# Altium footprint library PcbLib1.PcbLib: 1016 footprints (part 1 of 64)
Each footprint in its own frame and in the unit in brackets; x right, y up, seen from the top. Pads: shape width x height; smd on the part's side, far side on the other; paste and mask are expansions set on the pad; w line width, h text height; cw(c..) or ccw(c..) is an arc to the next point about the centre after c.
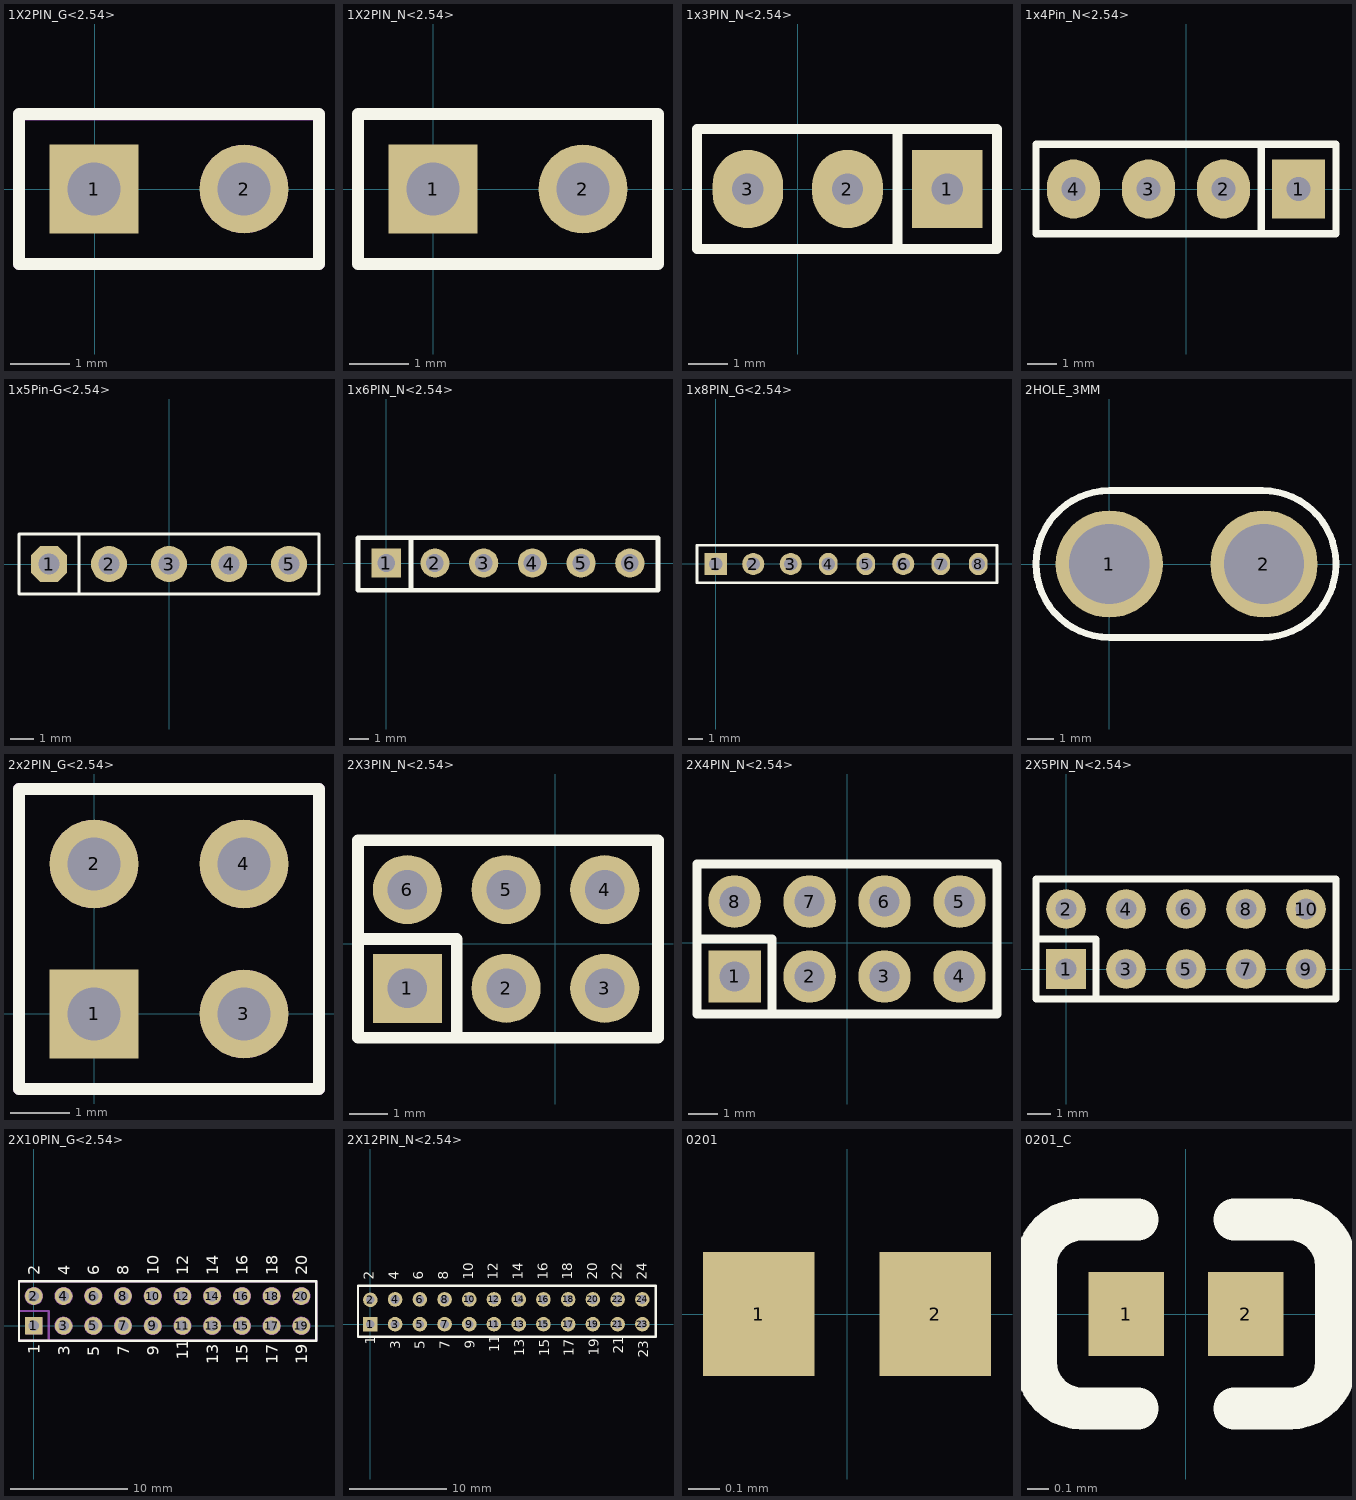
[diagram p0: the footprints below, top view; thin cyan lines are the x and y axes]

## 1X2PIN_G<2.54> [mm]
height 1.1
pads (2):
  rect 1.5x1.5 hole 0.9: 1(-0.01,0.007)
  round 1.5 hole 0.9: 2(2.53,0.007)
Top Overlay:
  lines w0.2: -1.28,-1.263 3.8,-1.263 3.8,1.277 -1.28,1.277 -1.28,-1.263
Mechanical 7:
  circle w0.2: c2.53,0.007 r0.648
  lines w0.2: -1.28,-1.263 -1.28,1.27 3.8,1.27 3.8,-1.263 -1.28,-1.263 ; -0.645,-0.628 0.625,-0.628 0.625,0.642 -0.645,0.642 -0.645,-0.628
3D body "1x2HDR.stp": height 8.41, standoff -2.52, extent -1.279,-1.261 3.801,1.279

## 1X2PIN_N<2.54> [mm] "两针跳线（未加焊）"
pads (2):
  rect 1.5x1.5 hole 0.9: 1(0,0)
  round 1.5 hole 0.9: 2(2.54,0)
Top Overlay:
  lines w0.2: -1.27,-1.27 -1.27,1.27 3.81,1.27 3.81,-1.27 -1.27,-1.27
3D body "HDR1X2_N.stp": height 8.68, standoff -3, extent -1.28,-1.26 3.8,1.28

## 1x3PIN_N<2.54> [mm]
pads (3):
  rect 1.8x2 hole 0.8: 1(3.81,0)
  oval 1.8x2 hole 0.8: 2(1.27,0) 3(-1.27,0)
Top Overlay:
  lines w0.254: 2.54,-1.524 2.54,1.524 ; -2.565,-1.524 5.08,-1.524 5.08,1.524 -2.565,1.524 -2.565,-1.524
3D body "1001-3.STEP": height 8.54, standoff -3, extent -2.54,-1.321 5.08,1.219

## 1x4Pin_N<2.54> [mm]
pads (4):
  rect 1.8x2 hole 0.8: 1(3.81,0)
  oval 1.8x2 hole 0.8: 2(1.27,0) 3(-1.27,0) 4(-3.81,0)
Top Overlay:
  lines w0.254: 2.54,-1.524 2.54,1.524 ; -5.08,-1.524 5.08,-1.524 5.08,1.524 -5.08,1.524 -5.08,-1.524
3D body "1001-4.STEP": height 8.54, standoff -3, extent -5.073,-1.267 5.087,1.273

## 1x5Pin-G<2.54> [mil]
pads (5):
  oct 60x60 hole 35: 1(-200,0)
  round 60 hole 35: 2(-100,0) 3(0,0) 4(100,0) 5(200,0)
Top Overlay:
  lines w5: -250,-50 250,-50 250,50 -250,50 -250,-49 ; -150,-50 -150,50
3D body "0.1inch Pin Strip-5Way.STEP": height 397.64, standoff -59.06, extent -250,-50 250,50

## 1x6PIN_N<2.54> [mm]
pads (6):
  rect 1.5x1.5 hole 0.9: 1(0,0)
  round 1.5 hole 0.9: 2(2.5,0) 3(5,0) 4(7.5,0) 5(10,0) 6(12.5,0)
Top Overlay:
  lines w0.254: 1.27,-1.346 1.27,1.245 ; -1.448,-1.397 -1.448,1.295 13.945,1.295 13.945,-1.397 -1.448,-1.397
3D body "1001-6.STEP": height 8.54, standoff -3, extent -1.372,-1.27 13.868,1.27

## 1x8PIN_G<2.54> [mm] "Connector; Header; 8 Position"
pads (8):
  rect 1.5x1.5 hole 0.9: 1(0,0)
  round 1.5 hole 0.9: 2(2.54,0) 3(5.08,0) 6(12.7,0)
  oval 1.27x1.5 hole 0.9: 4(7.62,0) 5(10.16,0) 7(15.24,0) 8(17.78,0)
Top Overlay:
  lines w0.2: -1.27,-1.27 -1.27,1.27 19.05,1.27 19.05,-1.27 -1.27,-1.27
3D body "8 pin strip.STEP": height 0.7, standoff -10.9, extent -1.27,-1.27 19.05,1.27

## 2HOLE_3MM [mm]
pads (2):
  round 4 hole 3: 1(0,0) 2(5.766,0)
Top Overlay:
  lines w0.25: 5.715,-2.736 ccw(c5.715,0) 5.715,2.736
  lines w0.254: 5.715,-2.736 0,-2.736 cw(c0,0) 0,2.736 5.715,2.736

## 2x2PIN_G<2.54> [mm]
height 1
pads (4):
  rect 1.5x1.5 hole 0.9: 1(0,0)
  round 1.5 hole 0.9: 2(0,2.54) 3(2.54,0) 4(2.54,2.54)
Top Overlay:
  lines w0.2: -1.27,-1.27 -1.27,3.81 3.81,3.81 3.81,-1.27 -1.27,-1.27
Mechanical 7:
  circle w0.2: c2.54,0 r0.648
  circle w0.2: c2.54,2.54 r0.648
  circle w0.2: c0,2.54 r0.648
  lines w0.2: -1.27,-1.27 3.81,-1.27 3.81,3.81 -1.27,3.81 -1.27,-1.27 ; -0.635,-0.635 -0.635,0.635 0.635,0.635 0.635,-0.635 -0.635,-0.635
3D body "HDR2X2.stp": height 8.41, standoff -2.51, extent -1.27,-1.273 3.81,3.807

## 2X3PIN_N<2.54> [mil]
pads (6):
  rect 70x70 hole 40: 1(-150,-45)
  round 70 hole 40: 2(-50,-45) 3(50,-45) 4(50,55) 5(-50,55) 6(-150,55)
Top Overlay:
  lines w12: -200,5 -100,5 -100,-95 ; -200,-95 104,-95 104,105 -200,105 -200,-95
3D body "1001-3.STEP": height 336.22, standoff -118.11, extent -198,-90 102,10
3D body "1001-3.STEP": height 336.22, standoff -118.11, extent -198,3.01 102,103.01

## 2X4PIN_N<2.54> [mil]
pads (8):
  rect 70x70 hole 40: 1(-150,-45)
  round 70 hole 40: 2(-50,-45) 3(50,-45) 4(150,-45) 5(150,55) 6(50,55) 7(-50,55) 8(-150,55)
Top Overlay:
  lines w12: -200,5 -100,5 -100,-95 ; -200,-95 -200,105 200,105 200,-95 -200,-95
3D body "1001-4.STEP": height 336.22, standoff -118.11, extent -198,-95 202,5
3D body "1001-4.STEP": height 336.22, standoff -118.11, extent -198,4 202,104

## 2X5PIN_N<2.54> [mil]
pads (10):
  rect 66x66 hole 35.43: 1(0,0)
  round 66 hole 35.43: 2(0,100) 3(100,0) 4(100,100) 5(200,0) 6(200,100) 7(300,0) 8(300,100) 9(400,0) 10(400,100)
Top Overlay:
  lines w12: -50,50 50,50 50,-50 ; -50,-50 -50,150 450,150 450,-50 -50,-50
3D body "1001-5.STEP": height 336.22, standoff -118.11, extent -49,-55 451,45
3D body "1001-5.STEP": height 336.22, standoff -118.11, extent -49,45 451,145

## 2X10PIN_G<2.54> [mm]
pads (20):
  rect 1.5x1.5 hole 0.9: 1(0,0)
  round 1.5 hole 0.9: 2(0,2.54) 3(2.54,0) 4(2.54,2.54) 5(5.08,0) 6(5.08,2.54) 7(7.62,0) 8(7.62,2.54) 9(10.16,0) 10(10.16,2.54) 11(12.7,0) 12(12.7,2.54) 13(15.24,0) 14(15.24,2.54) 15(17.78,0) 16(17.78,2.54) 17(20.32,0) 18(20.32,2.54) 19(22.86,0) 20(22.86,2.54)
Top Overlay:
  lines w0.2: -1.27,-1.27 -1.27,3.81 24.13,3.81 24.13,-1.27 -1.27,-1.27
  text "18" at 20.828,4.318 h1
  text "17" at 20.828,-3.302 h1
  text "14" at 15.748,4.318 h1
  text "13" at 15.748,-3.302 h1
  text "10" at 10.668,4.318 h1
  text "9" at 10.674,-2.539 h1
  text "8" at 8.128,4.318 h1
  text "7" at 8.134,-2.565 h1
  text "4" at 3.048,4.318 h1
  text "3" at 3.054,-2.565 h1
  text "5" at 5.594,-2.59 h1
  text "11" at 13.208,-2.921 h1
  text "15" at 18.288,-3.302 h1
  text "6" at 5.588,4.318 h1
  text "12" at 13.208,4.318 h1
  text "16" at 18.288,4.318 h1
  text "20" at 23.368,4.318 h1
  text "19" at 23.368,-3.302 h1
  text "1" at 0.514,-2.412 h1
  text "2" at 0.508,4.318 h1
Mechanical 7:
  circle w0.2: c2.54,0 r0.684
  circle w0.2: c5.08,0 r0.684
  circle w0.2: c7.62,0 r0.684
  circle w0.2: c10.16,0 r0.684
  circle w0.2: c12.7,0 r0.684
  circle w0.2: c15.24,0 r0.684
  circle w0.2: c17.78,0 r0.684
  circle w0.2: c20.32,0 r0.684
  circle w0.2: c22.86,0 r0.684
  circle w0.2: c22.86,2.54 r0.684
  circle w0.2: c20.32,2.54 r0.684
  circle w0.2: c17.78,2.54 r0.684
  circle w0.2: c15.24,2.54 r0.684
  circle w0.2: c12.7,2.54 r0.684
  circle w0.2: c10.16,2.54 r0.684
  circle w0.2: c7.62,2.54 r0.684
  circle w0.2: c5.08,2.54 r0.684
  circle w0.2: c2.54,2.54 r0.684
  circle w0.2: c0,2.54 r0.684
  lines w0.2: -1.27,1.27 1.27,1.27 1.27,-1.27 ; -1.27,-1.27 -1.27,3.81 24.13,3.81 24.13,-1.27 -1.27,-1.27 ; -0.635,-0.635 -0.635,0.635 0.635,0.635 0.635,-0.635 -0.635,-0.635
3D body "HDR 20 pin.STEP": height 8.38, standoff -2.54, extent -1.275,-1.263 24.125,3.817

## 2X12PIN_N<2.54> [mm] "双排针"
pads (24):
  rect 1.5x1.5 hole 0.9: 1(0,0)
  round 1.5 hole 0.9: 2(0,2.5) 3(2.54,0) 4(2.54,2.54) 5(5.08,0) 6(5.08,2.54) 7(7.62,0) 8(7.62,2.54) 9(10.16,0) 10(10.16,2.54) 11(12.7,0) 12(12.7,2.54) 13(15.24,0) 14(15.24,2.54) 15(17.78,0) 16(17.78,2.54) 17(20.32,0) 18(20.32,2.54) 19(22.86,0) 20(22.86,2.54) 21(25.4,0) 22(25.4,2.54) 23(27.94,0) 24(27.94,2.54)
Top Overlay:
  lines w0.254: -1.27,-1.295 29.337,-1.295 29.337,3.937 -1.27,3.937 -1.27,-1.295
  text "22" at 25.848,4.547 h1
  text "24" at 28.397,4.547 h1
  text "23" at 28.55,-3.454 h1
  text "21" at 26.001,-3.026 h1
  text "1" at 0.514,-2.136 h1
  text "19" at 23.452,-3.25 h1
  text "15" at 18.355,-3.297 h1
  text "11" at 13.257,-2.869 h1
  text "5" at 5.611,-2.564 h1
  text "3" at 3.062,-2.564 h1
  text "7" at 8.16,-2.564 h1
  text "9" at 10.709,-2.517 h1
  text "13" at 15.806,-3.297 h1
  text "17" at 20.903,-3.297 h1
  text "2" at 0.356,4.547 h1
  text "20" at 23.299,4.547 h1
  text "16" at 18.2,4.547 h1
  text "12" at 13.102,4.547 h1
  text "6" at 5.454,4.547 h1
  text "4" at 2.905,4.547 h1
  text "8" at 8.003,4.547 h1
  text "10" at 10.553,4.547 h1
  text "14" at 15.651,4.547 h1
  text "18" at 20.749,4.547 h1

## 0201 [mm]
pads (2):
  rect 0.36x0.4 smd mask+0.051: 1(-0.285,0) 2(0.285,0)

## 0201_C [mm]
pads (2):
  rect 0.36x0.4 smd mask+0.051: 1(-0.285,0) 2(0.285,0)
Top Overlay:
  lines w0.2: -0.23,-0.45 -0.495,-0.45 cw(c-0.495,-0.23) -0.715,-0.23 -0.715,0.23 cw(c-0.495,0.23) -0.495,0.45 -0.23,0.45 ; 0.23,-0.45 0.495,-0.45 ccw(c0.495,-0.23) 0.715,-0.23 0.715,0.23 ccw(c0.495,0.23) 0.495,0.45 0.23,0.45
3D body "User Library-0201(0603M) Cap.step": height 0.31, standoff 0, extent -0.305,-0.152 0.305,0.153